# Altium footprint library SIMCard.PcbLib: 15 footprints
Each footprint in its own frame and in the unit in brackets; x right, y up, seen from the top. Pads: shape width x height; smd on the part's side, far side on the other; paste and mask are expansions set on the pad; w line width, h text height; cw(c..) or ccw(c..) is an arc to the next point about the centre after c.
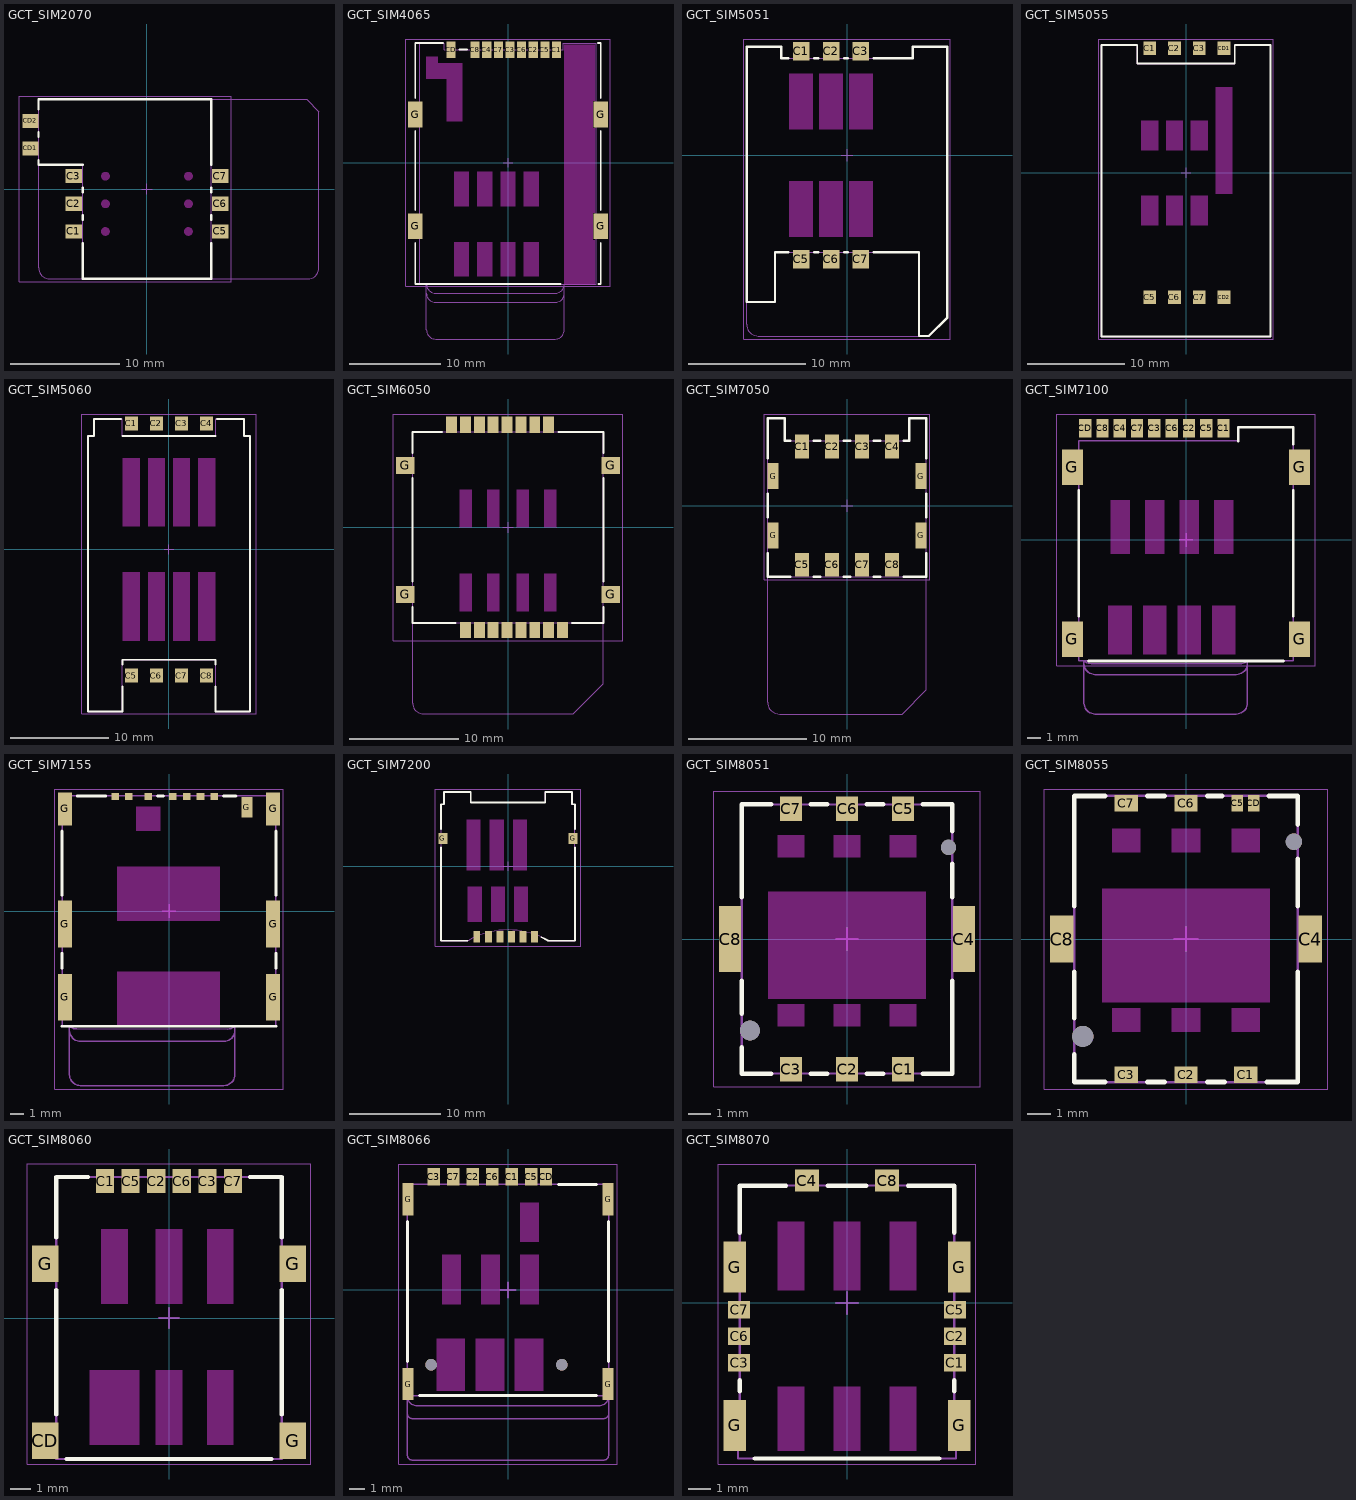
[diagram p0: the footprints below, top view; thin cyan lines are the x and y axes]

## GCT_SIM2070 [mm]
height 3
pads (8):
  rect 1.49x1.3 smd mask+0.07: C1(-6.73,-3.9) C2(-6.73,-1.36) C3(-6.73,1.18) C5(6.73,-3.9) C6(6.73,-1.36) C7(6.73,1.18) CD1(-10.695,3.72) CD2(-10.695,6.26)
Top Layer keep-out:
  circle w0.4: c-3.81,-3.9 r0.2
  circle w0.4: c-3.81,-1.36 r0.2
  circle w0.4: c-3.81,1.18 r0.2
  circle w0.4: c3.81,1.18 r0.2
  circle w0.4: c3.81,-1.36 r0.2
  circle w0.4: c3.81,-3.9 r0.2
Top Overlay:
  lines w0.2: -9.95,2.67 -9.95,2.23 -5.9,2.23 ; -9.95,4.77 -9.95,5.21 ; -9.95,7.31 -9.95,8.25 5.9,8.25 5.9,2.23 ; -5.9,-4.95 -5.9,-8.25 5.9,-8.25 5.9,-4.95 ; -5.9,-2.85 -5.9,-2.41 ; -5.9,-0.31 -5.9,0.13 ; 5.9,-2.85 5.9,-2.41 ; 5.9,-0.31 5.9,0.13
Top Assembly:
  lines w0.1: -9.95,2.23 -9.95,8.25 5.9,8.25 5.9,-8.25 -5.9,-8.25 -5.9,2.23 -9.95,2.23
  text ".Designator" at -2.252,-0.226 h1
Top Courtyard:
  lines w0.05: -11.75,-8.5 -11.75,8.5 7.75,8.5 7.75,-8.5 -11.75,-8.5
  lines w0.1: -0.5,0 0.5,0 ; 0,-0.5 0,0.5
Assembly Notes:
  lines w0.1: -9.95,2.23 -9.95,-7.25 ccw(c-8.95,-7.25) -8.95,-8.25 -5.9,-8.25 ; 5.9,-8.25 14.8,-8.25 ccw(c14.8,-7.25) 15.8,-7.25 15.8,7.111 14.661,8.25 5.9,8.25
3D body "sim2070-6-0-30-00-a.stp": height 3.46, standoff 0, extent -10.925,-8.32 7.123,8.32

## GCT_SIM4065 [mm]
height 1.7
pads (13):
  rect 1x1.8 smd mask+0.07: C1(5.3,12.35) C2(2.76,12.35) C3(0.22,12.35) C4(-2.32,12.35) C5(4.03,12.35) C6(1.49,12.35) C7(-1.05,12.35) C8(-3.59,12.35) CD(-6.21,12.35)
  rect 1.55x2.8 smd mask+0.07: G(-10.125,-6.95) G(-10.125,5.25) G(10.125,-6.95) G(10.125,5.25)
Top Layer keep-out:
  region: -7.65,10.85 -5,10.85 -5,4.5 -6.7,4.5 -6.7,9.15 -8.9,9.15 -8.9,11.55 -7.65,11.55
  region: -4.28,-4.78 -5.88,-4.78 -5.88,-0.98 -4.28,-0.98
  region: -4.28,-12.38 -5.88,-12.38 -5.88,-8.68 -4.28,-8.68
  region: -1.74,-12.38 -3.34,-12.38 -3.34,-8.68 -1.74,-8.68
  region: -1.74,-4.78 -3.34,-4.78 -3.34,-0.98 -1.74,-0.98
  region: 0.8,-4.78 -0.8,-4.78 -0.8,-0.98 0.8,-0.98
  region: 0.8,-12.38 -0.8,-12.38 -0.8,-8.68 0.8,-8.68
  region: 3.34,-12.38 1.74,-12.38 1.74,-8.68 3.34,-8.68
  region: 3.34,-4.78 1.74,-4.78 1.74,-0.98 3.34,-0.98
  region: 9.45,6.75 9.25,6.75 9.25,3.75 9.45,3.75 9.45,-5.45 9.25,-5.45 9.25,-8.45 9.45,-8.45 9.45,-13.25 6.15,-13.25 6.15,12.85 9.45,12.85
Top Overlay:
  lines w0.2: -10.125,-8.75 -10.125,-13.25 5.75,-13.25 ; -10.125,-5.15 -10.125,3.45 ; -10.125,7.05 -10.125,13.05 -7.11,13.05 ; -5.31,12.35 -4.49,12.35 ; 9.839,13.05 10.125,13.05 10.125,7.05 ; 9.85,-13.25 10.125,-13.25 10.125,-8.75 ; 10.125,-5.15 10.125,3.45
Top Assembly:
  lines w0.1: -9.65,-13.25 -9.65,13.05 -6.96,13.05 -6.96,12.35 6.05,12.35 6.05,13.05 9.65,13.05 9.65,-13.25 -9.65,-13.25
  text ".Designator" at -2.252,-0.226 h1
Top Courtyard:
  lines w0.05: -11.15,-13.5 -11.15,13.5 11.15,13.5 11.15,-13.5 -11.15,-13.5
  lines w0.1: -0.5,0 0.5,0 ; 0,-0.5 0,0.5
Assembly Notes:
  lines w0.1: -8.9,-14.25 ccw(c-7.9,-14.25) -7.9,-15.25 5.147,-15.25 ccw(c5.147,-14.25) 6.147,-14.25 ; -8.9,-18.25 ccw(c-7.9,-18.25) -7.9,-19.25 5.147,-19.25 ccw(c5.147,-18.25) 6.147,-18.25 6.147,-13.25 cw(c5.147,-13.25) 5.147,-14.25 -7.9,-14.25 cw(c-7.9,-13.25) -8.9,-13.25 -8.9,-18.25
  text "Location of card pushed" at 0.208,-14.12 h0.51
  text "Location of card inserted" at 0.208,-15.163 h0.51
  text "Location of card ejected" at 0.208,-19.118 h0.51
3D body "sim4065-8-1-15-00-a.stp": height 1.66, standoff 0.01, extent -10.5,-13.2 10.5,13.2

## GCT_SIM5051 [mm]
height 1.85
pads (6):
  rect 1.4x1.6 smd mask+0.07: C1(-3.9,8.85) C2(-1.36,8.85) C3(1.18,8.85) C5(-3.9,-8.85) C6(-1.36,-8.85) C7(1.18,-8.85)
Top Layer keep-out:
  region: 2.18,-6.95 0.18,-6.95 0.18,-2.2 2.18,-2.2
  region: -0.36,-6.95 -2.36,-6.95 -2.36,-2.2 -0.36,-2.2
  region: -2.9,-6.95 -4.9,-6.95 -4.9,-2.2 -2.9,-2.2
  region: -2.9,2.2 -4.9,2.2 -4.9,6.95 -2.9,6.95
  region: -0.36,2.2 -2.36,2.2 -2.36,6.95 -0.36,6.95
  region: 2.18,2.2 0.18,2.2 0.18,6.95 2.18,6.95
Top Overlay:
  lines w0.2: -5,-8.25 -6.13,-8.25 -6.13,-12.5 -8.55,-12.5 -8.55,9.25 -5.6,9.25 -5.6,8.25 -5,8.25 ; -2.8,-8.25 -2.46,-8.25 ; -2.8,8.25 -2.46,8.25 ; -0.26,-8.25 0.08,-8.25 ; -0.26,8.25 0.08,8.25 ; 2.28,-8.25 6.13,-8.25 6.13,-15.4 6.97,-15.4 8.55,-13.82 8.55,9.25 5.6,9.25 5.6,8.25 2.28,8.25
Top Assembly:
  lines w0.1: -8.55,-12.5 -6.13,-12.5 -6.13,-8.25 6.13,-8.25 6.13,-15.4 6.97,-15.4 8.55,-13.82 8.55,9.25 5.6,9.25 5.6,8.25 -5.6,8.25 -5.6,9.25 -8.55,9.25 -8.55,-12.5
  text ".Designator" at -2.252,-0.226 h1
Top Courtyard:
  lines w0.05: -8.8,-15.65 -8.8,9.9 8.8,9.9 8.8,-15.65 -8.8,-15.65
  lines w0.1: -0.5,0 0.5,0 ; 0,-0.5 0,0.5
Assembly Notes:
  lines w0.1: -8.55,-12.5 -8.55,-14.4 ccw(c-7.55,-14.4) -7.55,-15.4 6.13,-15.4
  text "Card Area" at 3.885,-15.263 h0.51
3D body "sim5051-6-0-18-00-a.stp": height 1.88, standoff -0.02, extent -8.876,-15.65 8.824,9

## GCT_SIM5055 [mm]
height 2.5
pads (8):
  rect 1.3x1.4 smd mask+0.07: C1(-3.72,12.77) C2(-1.18,12.77) C3(1.36,12.77) C5(-3.72,-12.77) C6(-1.18,-12.77) C7(1.36,-12.77) CD1(3.9,12.77) CD2(3.9,-12.77)
Top Layer keep-out:
  region: 4.75,-2.15 3.05,-2.15 3.05,8.78 4.75,8.78
  region: 2.21,2.32 0.51,2.32 0.51,5.32 2.21,5.32
  region: -0.33,2.32 -2.03,2.32 -2.03,5.32 -0.33,5.32
  region: -2.87,2.32 -4.57,2.32 -4.57,5.32 -2.87,5.32
  region: -2.87,-5.37 -4.57,-5.37 -4.57,-2.37 -2.87,-2.37
  region: -0.33,-5.37 -2.03,-5.37 -2.03,-2.37 -0.33,-2.37
  region: 2.21,-5.37 0.51,-5.37 0.51,-2.37 2.21,-2.37
Top Overlay:
  lines w0.2: -8.68,-16.8 8.68,-16.8 8.68,13.1 5,13.1 5,11.2 -5,11.2 -5,13.1 -8.68,13.1 -8.68,-16.8
Top Assembly:
  lines w0.1: -8.68,-16.8 8.68,-16.8 8.68,13.1 5,13.1 5,11.2 -5,11.2 -5,13.1 -8.68,13.1 -8.68,-16.8
  text ".Designator" at -2.252,-0.226 h1
Top Courtyard:
  lines w0.05: -8.93,-17.05 8.93,-17.05 8.93,13.72 -8.93,13.72 -8.93,-17.05
  lines w0.1: -0.5,0 0.5,0 ; 0,-0.5 0,0.5
3D body "sim5055-6-1-25-00-a.stp": height 2.55, standoff 0, extent -8.675,-16.65 8.675,13.25

## GCT_SIM5060 [mm]
height 2.6
pads (8):
  rect 1.3x1.4 smd mask+0.07: C1(-3.81,12.77) C2(-1.27,12.77) C3(1.27,12.77) C4(3.81,12.77) C5(-3.81,-12.77) C6(-1.27,-12.77) C7(1.27,-12.77) C8(3.81,-12.77)
Top Layer keep-out:
  region: 4.66,-9.23 2.96,-9.23 2.96,-2.33 4.66,-2.33
  region: 2.12,-9.23 0.42,-9.23 0.42,-2.33 2.12,-2.33
  region: -0.42,-9.23 -2.12,-9.23 -2.12,-2.33 -0.42,-2.33
  region: -2.96,-9.23 -4.66,-9.23 -4.66,-2.33 -2.96,-2.33
  region: -2.96,2.33 -4.66,2.33 -4.66,9.23 -2.96,9.23
  region: -0.42,2.33 -2.12,2.33 -2.12,9.23 -0.42,9.23
  region: 2.12,2.33 0.42,2.33 0.42,9.23 2.12,9.23
  region: 4.66,2.33 2.96,2.33 2.96,9.23 4.66,9.23
Top Overlay:
  lines w0.2: -4.86,13.23 -7.6,13.23 -7.6,11.5 -8.2,11.5 -8.2,-16.42 -4.73,-16.42 -4.73,-13.87 ; -4.73,-11.67 -4.73,-11.175 4.73,-11.175 4.73,-11.67 ; -4.73,11.5 4.73,11.5 ; 4.73,-13.87 4.73,-16.42 8.2,-16.42 8.2,11.5 7.6,11.5 7.6,13.23 4.86,13.23
Top Assembly:
  lines w0.1: -8.2,-16.42 -8.2,11.5 -7.6,11.5 -7.6,13.23 -4.73,13.23 -4.73,11.5 4.73,11.5 4.73,13.23 7.6,13.23 7.6,11.5 8.2,11.5 8.2,-16.42 4.73,-16.42 4.73,-11.175 -4.73,-11.175 -4.73,-16.42 -8.2,-16.42
  text ".Designator" at -2.252,-0.226 h1
Top Courtyard:
  lines w0.05: -8.85,-16.67 -8.85,13.72 8.85,13.72 8.85,-16.67 -8.85,-16.67
  lines w0.1: -0.5,0 0.5,0 ; 0,-0.5 0,0.5
3D body "sim5060-6-0-26-00-a.stp": height 2.6, standoff 0, extent -8.6,-16.42 8.6,13.23

## GCT_SIM6050 [mm]
height 3
pads (20):
  rect 1x1.5 smd mask+0.07: B_C1(-2.63,-9.4) B_C2(-0.09,-9.4) B_C3(2.45,-9.4) B_C4(4.99,-9.4) B_C5(-3.9,-9.4) B_C6(-1.36,-9.4) B_C7(1.18,-9.4) B_C8(3.72,-9.4) T_C1(-3.9,9.4) T_C2(-1.36,9.4) T_C3(1.18,9.4) T_C4(3.72,9.4) T_C5(-5.17,9.4) T_C6(-2.63,9.4) T_C7(-0.09,9.4) T_C8(2.45,9.4)
  rect 1.7x1.55 smd mask+0.07: G(-9.42,-6.13) G(-9.42,5.68) G(9.42,-6.13) G(9.42,5.68)
Top Layer keep-out:
  rectangle: 3.315,-7.7 4.465,-4.2
  rectangle: 0.775,-7.7 1.925,-4.2
  rectangle: -1.925,-7.7 -0.775,-4.2
  rectangle: -4.465,-7.7 -3.315,-4.2
  rectangle: -4.465,0 -3.315,3.5
  rectangle: -1.925,0 -0.775,3.5
  rectangle: 0.775,0 1.925,3.5
  rectangle: 3.315,0 4.465,3.5
Top Overlay:
  lines w0.2: -8.75,-7.305 -8.75,-8.75 -4.8,-8.75 ; -8.75,-4.955 -8.75,4.505 ; -8.75,6.855 -8.75,8.75 -6.07,8.75 ; 4.62,8.75 8.75,8.75 8.75,6.855 ; 5.89,-8.75 8.75,-8.75 8.75,-7.305 ; 8.75,-4.955 8.75,4.505
Top Assembly:
  lines w0.1: -8.75,-8.75 8.75,-8.75 8.75,8.75 -8.75,8.75 -8.75,-8.75
  text ".Designator" at -2.252,-0.226 h1
Top Courtyard:
  lines w0.05: -10.52,-10.4 -10.52,10.4 10.52,10.4 10.52,-10.4 -10.52,-10.4
  lines w0.1: -0.5,0 0.5,0 ; 0,-0.5 0,0.5
Assembly Notes:
  lines w0.1: -8.75,-8.75 -8.75,-16.1 ccw(c-7.75,-16.1) -7.75,-17.1 5.963,-17.1 8.75,-14.313 8.75,-8.75
3D body "sim6050-8-0-30-00-a.stp": height 2.99, standoff -0.05, extent -9.55,-9.744 9.55,9.756

## GCT_SIM7050 [mm]
height 2.4
pads (12):
  rect 1.2x2 smd mask+0.07: C1(-3.81,5) C2(-1.27,5) C3(1.27,5) C4(3.81,5) C5(-3.81,-5) C6(-1.27,-5) C7(1.27,-5) C8(3.81,-5)
  rect 0.9x2.2 smd mask+0.07: G(-6.25,-2.5) G(-6.25,2.5) G(6.25,-2.5) G(6.25,2.5)
Top Overlay:
  lines w0.2: -6.7,-4 -6.7,-6 -4.81,-6 ; -6.7,-1 -6.7,1 ; -6.7,4 -6.7,7.4 -5.25,7.4 -5.25,5.5 -4.81,5.5 ; -2.81,-6 -2.27,-6 ; -2.81,5.5 -2.27,5.5 ; -0.27,-6 0.27,-6 ; -0.27,5.5 0.27,5.5 ; 2.27,-6 2.81,-6 ; 2.27,5.5 2.81,5.5 ; 4.81,-6 6.7,-6 6.7,-4 ; 4.81,5.5 5.25,5.5 5.25,7.4 6.7,7.4 6.7,4 ; 6.7,-1 6.7,1
Top Assembly:
  lines w0.1: -6.7,-6 -6.7,7.4 -5.25,7.4 -5.25,5.5 5.25,5.5 5.25,7.4 6.7,7.4 6.7,-6 -6.7,-6
  text ".Designator" at -2.252,-0.226 h1
Top Courtyard:
  lines w0.05: -7,-6.25 7,-6.25 7,7.75 -7,7.75 -7,-6.25
  lines w0.1: -0.5,0 0.5,0 ; 0,-0.5 0,0.5
Assembly Notes:
  lines w0.1: -6.7,-6 -6.7,-16.6 ccw(c-5.7,-16.6) -5.7,-17.6 4.65,-17.6 6.7,-15.55 6.7,-6
3D body "SIM7050-6-0-00-A.stp": height 2.4, standoff -0.05, extent -6.705,-6 6.705,7.4

## GCT_SIM7100 [mm]
height 1.8
pads (13):
  rect 0.9x1.35 smd mask+0.07: C1(2.755,8.215) C2(0.215,8.215) C3(-2.325,8.215) C4(-4.865,8.215) C5(1.485,8.215) C6(-1.055,8.215) C7(-3.595,8.215) C8(-6.135,8.215) CD(-7.405,8.215)
  rect 1.56x2.61 smd mask+0.07: G(-8.34,-7.29) G(-8.34,5.34) G(8.34,-7.29) G(8.34,5.34)
Top Layer keep-out:
  region: 3.475,-1.03 2.075,-1.03 2.075,2.91 3.475,2.91
  region: 0.935,-1.03 -0.465,-1.03 -0.465,2.91 0.935,2.91
  region: -1.605,-1.03 -3.005,-1.03 -3.005,2.91 -1.605,2.91
  region: -4.145,-1.03 -5.545,-1.03 -5.545,2.91 -4.145,2.91
  region: -3.995,-8.41 -5.695,-8.41 -5.695,-4.83 -3.995,-4.83
  region: -1.455,-8.41 -3.155,-8.41 -3.155,-4.83 -1.455,-4.83
  region: 1.085,-8.41 -0.615,-8.41 -0.615,-4.83 1.085,-4.83
  region: 3.625,-8.41 1.925,-8.41 1.925,-4.83 3.625,-4.83
Top Overlay:
  lines w0.2: -7.875,-5.585 -7.875,3.635 ; -7.16,-8.89 7.16,-8.89 ; 3.84,7.27 3.84,8.28 7.875,8.28 7.875,7.045 ; 7.875,-5.585 7.875,3.635
Top Assembly:
  lines w0.1: -7.875,-8.89 -7.875,7.27 3.84,7.27 3.84,8.28 7.875,8.28 7.875,-8.89 -7.875,-8.89
  text ".Designator" at -2.252,-0.226 h1
Top Courtyard:
  lines w0.05: -9.5,-9.25 -9.5,9.25 9.5,9.25 9.5,-9.25 -9.5,-9.25
  lines w0.1: -0.5,0 0.5,0 ; 0,-0.5 0,0.5
Assembly Notes:
  lines w0.1: -7.495,-9.09 ccw(c-6.695,-9.09) -6.695,-9.89 3.705,-9.89 ccw(c3.705,-9.09) 4.505,-9.09 ; -7.495,-8.89 -7.495,-11.99 ccw(c-6.695,-11.99) -6.695,-12.79 3.705,-12.79 ccw(c3.705,-11.99) 4.505,-11.99 4.505,-8.89 cw(c3.97,-8.276) 3.985,-9.09 -6.964,-9.09 cw(c-6.95,-8.262) -7.493,-8.887
  text "Location of card pushed" at -1.2,-8.96 h0.51
  text "Location of card inserted" at -1.2,-9.803 h0.51
  text "Location of card ejected" at -1.2,-12.658 h0.51
3D body "SIM7100-6-1-15-00-A.stp": height 1.48, standoff -0.05, extent -8.362,-8.93 8.388,8.4

## GCT_SIM7155 [mm]
height 1.53
pads (14):
  rect 0.55x0.5 smd mask+0.07: C1(2.285,8.3) C2(0.285,8.3) C3(-3.905,8.3) C5(3.285,8.3) C6(1.285,8.3) C7(-2.905,8.3) CD(-1.5,8.3)
  rect 1x3.4 smd mask+0.07: G(-7.55,-6.25) G(-7.55,-0.95) G(7.55,-6.25) G(7.55,-0.95)
  rect 1x2.4 smd mask+0.07: G(-7.55,7.4) G(7.55,7.4)
  rect 0.8x1.5 smd mask+0.07: G(5.65,7.53)
Top Layer keep-out:
  region: -0.65,5.83 -2.39,5.83 -2.39,7.57 -0.65,7.57
  region: 3.67,-0.69 -3.75,-0.69 -3.75,3.21 3.67,3.21
  region: 3.67,-8.3 -3.75,-8.3 -3.75,-4.4 3.67,-4.4
Top Overlay:
  lines w0.2: -7.75,-8.35 7.75,-8.35 ; -7.75,-4.15 -7.75,-3.05 ; -7.75,1.15 -7.75,5.8 ; -6.65,8.35 -4.58,8.35 ; -0.825,8.35 -0.39,8.35 ; 3.96,8.35 4.85,8.35 ; 7.75,-4.15 7.75,-3.05 ; 7.75,1.15 7.75,5.8
Top Assembly:
  lines w0.1: -7.75,-8.35 7.75,-8.35 7.75,8.35 -7.75,8.35 -7.75,-8.35
  text ".Designator" at -2.252,-0.226 h1
Top Courtyard:
  lines w0.05: -8.3,-12.9 -8.3,8.85 8.3,8.85 8.3,-12.9 -8.3,-12.9
  lines w0.1: -0.5,0 0.5,0 ; 0,-0.5 0,0.5
Assembly Notes:
  lines w0.1: -7.22,-8.65 ccw(c-6.42,-8.65) -6.42,-9.45 3.98,-9.45 ccw(c3.98,-8.65) 4.78,-8.65 ; -7.22,-8.35 -7.22,-11.85 ccw(c-6.42,-11.85) -6.42,-12.65 3.98,-12.65 ccw(c3.98,-11.85) 4.78,-11.85 4.78,-8.35 ; -7.218,-8.347 ccw(c-6.675,-7.722) -6.689,-8.55 4.259,-8.55 ccw(c4.245,-7.736) 4.779,-8.35
  text "Location of card ejected" at -1,-12.518 h0.51
  text "Location of card inserted" at -1,-9.363 h0.51
  text "Location of card pushed" at -1,-8.42 h0.51
3D body "sim7155-6-1-14-a.stp": height 1.43, standoff 0, extent -7.78,-8.32 7.78,8.45

## GCT_SIM7200 [mm]
height 1.75
pads (8):
  rect 0.75x1.25 smd mask+0.07: C1(-2.16,-7.75) C2(0.38,-7.75) C3(2.92,-7.75) C5(-3.43,-7.75) C6(-0.89,-7.75) C7(1.65,-7.75)
  rect 1x1.2 smd mask+0.07: G(-7.15,3.075) G(7.15,3.075)
Top Layer keep-out:
  region: 2.05,-0.405 0.55,-0.405 0.55,5.095 2.05,5.095
  region: -0.49,-0.405 -1.99,-0.405 -1.99,5.095 -0.49,5.095
  region: -3.03,-0.405 -4.53,-0.405 -4.53,5.095 -3.03,5.095
  region: -2.9,-6.105 -4.4,-6.105 -4.4,-2.215 -2.9,-2.215
  region: -0.36,-6.105 -1.86,-6.105 -1.86,-2.215 -0.36,-2.215
  region: 2.18,-6.105 0.68,-6.105 0.68,-2.215 2.18,-2.215
Top Overlay:
  lines w0.2: -7.35,2.075 -7.35,-8.175 -4.42,-8.175 ; -7.35,4.075 -7.35,6.825 -7.025,6.825 -7.025,8.175 -4.095,8.175 -4.095,7.025 4.095,7.025 4.095,8.175 7.025,8.175 7.025,6.825 7.35,6.825 7.35,4.075 ; 3.695,-7.794 cw(c0,-15.715) 4.37,-8.146 ; 4.42,-8.175 7.35,-8.175 7.35,2.075
Top Assembly:
  lines w0.1: -4.42,-8.175 -7.35,-8.175 -7.35,6.825 -7.025,6.825 -7.025,8.175 -4.095,8.175 -4.095,7.025 4.095,7.025 4.095,8.175 7.025,8.175 7.025,6.825 7.35,6.825 7.35,-8.175 4.42,-8.175 ; -4.37,-8.146 cw(c0,-15.715) 4.37,-8.146
  text ".Designator" at -2.252,-0.226 h1
Top Courtyard:
  lines w0.05: -8,-8.75 8,-8.75 8,8.5 -8,8.5 -8,-8.75
  lines w0.1: -0.5,0 0.5,0 ; 0,-0.5 0,0.5
3D body "step_temp.STEP": height 1.74, standoff -0.01, extent -7.355,-8.235 7.345,8.115

## GCT_SIM8051 [mm]
height 1.35
pads (10):
  rect 1x1.1 smd mask+0.07: C1(2.54,-5.9) C2(0,-5.9) C3(-2.54,-5.9) C5(2.54,5.9) C6(0,5.9) C7(-2.54,5.9)
  rect 1x3 smd mask+0.07: C4(5.3,0) C8(-5.3,0)
  round 0.9 hole 0.9 unplated mask+0.07: ""(-4.4,-4.15)
  round 0.7 hole 0.7 unplated mask+0.07: ""(4.6,4.15)
Top Layer keep-out:
  region: 3.14,3.7 1.94,3.7 1.94,4.7 3.14,4.7
  region: 0.6,3.7 -0.6,3.7 -0.6,4.7 0.6,4.7
  region: -1.94,3.7 -3.14,3.7 -3.14,4.7 -1.94,4.7
  region: 3.575,-2.7 -3.575,-2.7 -3.575,2.15 3.575,2.15
  region: -1.94,-3.95 -3.14,-3.95 -3.14,-2.95 -1.94,-2.95
  region: 0.6,-3.95 -0.6,-3.95 -0.6,-2.95 0.6,-2.95
  region: 3.14,-3.95 1.94,-3.95 1.94,-2.95 3.14,-2.95
Top Overlay:
  lines w0.2: -4.77,-4.915 -4.77,-6.1 -3.44,-6.1 ; -4.77,-3.385 -4.77,-1.9 ; -4.77,1.9 -4.77,6.1 -3.44,6.1 ; -1.64,-6.1 -0.9,-6.1 ; -1.64,6.1 -0.9,6.1 ; 0.9,-6.1 1.64,-6.1 ; 0.9,6.1 1.64,6.1 ; 3.44,-6.1 4.77,-6.1 4.77,-1.9 ; 3.44,6.1 4.77,6.1 4.77,4.881 ; 4.77,1.9 4.77,3.419
Top Assembly:
  lines w0.1: -4.77,-6.1 -4.77,6.1 4.77,6.1 4.77,-6.1 -4.77,-6.1
  text "PCB Edge" at 2.566,-5.918 h0.51
  text ".Designator" at -2.252,-0.226 h1
Top Courtyard:
  lines w0.05: -6.05,-6.7 -6.05,6.7 6.05,6.7 6.05,-6.7 -6.05,-6.7
  lines w0.1: -0.5,0 0.5,0 ; 0,-0.5 0,0.5
3D body "step_temp.STEP": height 1.35, standoff 0, extent -5.4,-6.1 5.4,6.1

## GCT_SIM8055 [mm]
height 1.35
pads (11):
  rect 1x0.7 smd mask+0.07: C1(2.54,-5.795) C2(0,-5.795) C3(-2.54,-5.795) C6(0,5.795) C7(-2.54,5.795)
  rect 1x2 smd mask+0.07: C4(5.3,0) C8(-5.3,0)
  rect 0.5x0.7 smd mask+0.07: C5(2.19,5.795) CD(2.89,5.795)
  round 0.9 hole 0.9 unplated mask+0.07: ""(-4.4,-4.15)
  round 0.7 hole 0.7 unplated mask+0.07: ""(4.6,4.15)
Top Layer keep-out:
  region: 3.14,3.7 1.94,3.7 1.94,4.7 3.14,4.7
  region: 0.6,3.7 -0.6,3.7 -0.6,4.7 0.6,4.7
  region: -1.94,3.7 -3.14,3.7 -3.14,4.7 -1.94,4.7
  region: 3.575,-2.7 -3.575,-2.7 -3.575,2.15 3.575,2.15
  region: -1.94,-3.95 -3.14,-3.95 -3.14,-2.95 -1.94,-2.95
  region: 0.6,-3.95 -0.6,-3.95 -0.6,-2.95 0.6,-2.95
  region: 3.14,-3.95 1.94,-3.95 1.94,-2.95 3.14,-2.95
Top Overlay:
  lines w0.2: -4.77,-4.915 -4.77,-6.1 -3.44,-6.1 ; -4.77,-3.385 -4.77,-1.4 ; -4.77,1.4 -4.77,6.1 -3.44,6.1 ; -1.64,-6.1 -0.9,-6.1 ; -1.64,6.1 -0.9,6.1 ; 0.9,-6.1 1.64,-6.1 ; 0.9,6.1 1.54,6.1 ; 3.44,-6.1 4.77,-6.1 4.77,-1.4 ; 3.54,6.1 4.77,6.1 4.77,4.881 ; 4.77,1.4 4.77,3.419
Top Assembly:
  lines w0.1: -4.77,-6.1 -4.77,6.1 4.77,6.1 4.77,-6.1 -4.77,-6.1
  text "PCB Edge" at 2.566,-5.918 h0.51
  text ".Designator" at -2.252,-0.226 h1
Top Courtyard:
  lines w0.05: -6.05,-6.395 6.05,-6.395 6.05,6.395 -6.05,6.395 -6.05,-6.395
  lines w0.1: -0.5,0 0.5,0 ; 0,-0.5 0,0.5
3D body "SIM8055-6-1-14-00-A.stp": height 1.35, standoff 0, extent -5.4,-6.1 5.4,6.1

## GCT_SIM8060 [mm]
height 1.4
pads (10):
  rect 0.9x1.2 smd mask+0.07: C1(-3.175,6.8) C2(-0.635,6.8) C3(1.905,6.8) C5(-1.905,6.8) C6(0.635,6.8) C7(3.175,6.8)
  rect 1.3x1.8 smd mask+0.07: CD(-6.15,-6.1) G(-6.15,2.7) G(6.15,-6.1) G(6.15,2.7)
Top Layer keep-out:
  region: 3.19,-6.3 1.89,-6.3 1.89,-2.6 3.19,-2.6
  region: 0.65,-6.3 -0.65,-6.3 -0.65,-2.6 0.65,-2.6
  region: -1.49,-6.3 -3.93,-6.3 -3.93,-2.6 -1.49,-2.6
  region: -2.06,0.72 -3.36,0.72 -3.36,4.42 -2.06,4.42
  region: 0.65,0.72 -0.65,0.72 -0.65,4.42 0.65,4.42
  region: 3.19,0.72 1.89,0.72 1.89,4.42 3.19,4.42
Top Overlay:
  lines w0.2: -5.6,-4.8 -5.6,1.4 ; -5.6,4 -5.6,7 -4.025,7 ; -5.1,-7 5.1,-7 ; 4.025,7 5.6,7 5.6,4 ; 5.6,-4.8 5.6,1.4
Top Assembly:
  lines w0.1: -5.6,-7 -5.6,7 5.6,7 5.6,-7 -5.6,-7
  text ".Designator" at -2.252,-0.226 h1
Top Courtyard:
  lines w0.05: -7.05,-7.25 -7.05,7.65 7.05,7.65 7.05,-7.25 -7.05,-7.25
  lines w0.1: -0.5,0 0.5,0 ; 0,-0.5 0,0.5
3D body "sim8060-6-0-14-00-a.stp": height 1.4, standoff -0.03, extent -6.2,-7 6.2,7.1

## GCT_SIM8066 [mm]
height 1.44
pads (13):
  rect 0.8x1.14 smd mask+0.07: C1(0.25,7.37) C2(-2.29,7.37) C3(-4.83,7.37) C5(1.52,7.37) C6(-1.02,7.37) C7(-3.56,7.37) CD(2.47,7.37)
  rect 0.7x2.1 smd mask+0.07: G(-6.5,-6.11) G(-6.5,5.89) G(6.5,-6.11) G(6.5,5.89)
  round 0.75 hole 0.75 unplated mask+0.07: ""(-5,-4.86) ""(3.5,-4.86)
Top Layer keep-out:
  region: 2.285,-6.56 0.435,-6.56 0.435,-3.16 2.285,-3.16
  region: -0.255,-6.56 -2.105,-6.56 -2.105,-3.16 -0.255,-3.16
  region: -2.795,-6.56 -4.645,-6.56 -4.645,-3.16 -2.795,-3.16
  region: -3.08,-0.915 -4.28,-0.915 -4.28,2.295 -3.08,2.295
  region: -0.54,-0.915 -1.74,-0.915 -1.74,2.295 -0.54,2.295
  region: 2,-0.915 0.8,-0.915 0.8,2.295 2,2.295
  region: 2,3.135 0.8,3.135 0.8,5.685 2,5.685
Top Overlay:
  lines w0.2: -6.545,-4.66 -6.545,4.44 ; -5.75,-6.86 5.75,-6.86 ; 3.27,6.86 5.75,6.86 ; 6.545,-4.66 6.545,4.44
Top Assembly:
  lines w0.1: -6.545,-6.86 -6.545,6.86 6.545,6.86 6.545,-6.86 -6.545,-6.86
  text ".Designator" at -2.252,-0.226 h1
Top Courtyard:
  lines w0.05: -7.1,-11.31 7.1,-11.31 7.1,8.19 -7.1,8.19 -7.1,-11.31
  lines w0.1: -0.5,0 0.5,0 ; 0,-0.5 0,0.5
Assembly Notes:
  lines w0.1: -6.545,-10.713 ccw(c-6.198,-10.713) -6.198,-11.06 ; -6.545,-10.71 -6.545,-6.86 ccw(c-5.947,-6.913) -6,-7.51 6,-7.51 ccw(c5.947,-6.913) 6.545,-6.86 6.545,-10.71 ; -6.545,-8.013 ccw(c-6.198,-8.013) -6.198,-8.36 ; -6.2,-11.06 6.2,-11.06 ; -6.2,-8.36 6.2,-8.36 ccw(c6.222,-8.037) 6.545,-8.06 ; 6.198,-11.06 ccw(c6.198,-10.713) 6.545,-10.713
  text "Push Stroke Position" at 1.9,-7.363 h0.51
  text "Push Lock Position" at 1.9,-8.26 h0.51
  text "Push Eject Position" at 1.9,-10.915 h0.51
3D body "SIM8066-6-1-14-01-A--3DModel-STEP-56544.STEP": height 1.44, standoff -0.37, extent -6.545,-6.94 6.545,7.64

## GCT_SIM8070 [mm]
height 1.25
pads (12):
  rect 1x0.8 smd mask+0.07: C1(4.9,-2.715) C2(4.9,-1.515) C3(-4.9,-2.715) C5(4.9,-0.315) C6(-4.9,-1.515) C7(-4.9,-0.315)
  rect 1.1x1 smd mask+0.07: C4(-1.82,5.565) C8(1.82,5.565)
  rect 1x2.3 smd mask+0.07: G(-5.1,-5.565) G(-5.1,1.635) G(5.1,-5.565) G(5.1,1.635)
Top Layer keep-out:
  region: 3.14,-6.715 1.94,-6.715 1.94,-3.815 3.14,-3.815
  region: 0.6,-6.715 -0.6,-6.715 -0.6,-3.815 0.6,-3.815
  region: -1.94,-6.715 -3.14,-6.715 -3.14,-3.815 -1.94,-3.815
  region: -1.94,0.585 -3.14,0.585 -3.14,3.685 -1.94,3.685
  region: 0.6,0.585 -0.6,0.585 -0.6,3.685 0.6,3.685
  region: 3.14,0.585 1.94,0.585 1.94,3.685 3.14,3.685
Top Overlay:
  lines w0.2: -4.875,-4.015 -4.875,-3.515 ; -4.875,3.185 -4.875,5.335 -2.77,5.335 ; -4.2,-7.065 4.2,-7.065 ; -0.87,5.335 0.87,5.335 ; 2.77,5.335 4.875,5.335 4.875,3.185 ; 4.875,-4.015 4.875,-3.515
Top Assembly:
  lines w0.1: -4.95,-7.065 4.95,-7.065 4.95,-6.545 4.875,-6.545 4.875,5.335 -4.875,5.335 -4.875,-6.545 -4.95,-6.545 -4.95,-7.065
  text "PCB Edge" at 2.666,-6.883 h0.51
  text ".Designator" at -2.252,-0.226 h1
Top Courtyard:
  lines w0.05: -5.85,-7.315 -5.85,6.315 5.85,6.315 5.85,-7.315 -5.85,-7.315
  lines w0.1: -0.5,0 0.5,0 ; 0,-0.5 0,0.5
3D body "SIM8070-6-0-11-00-A.stp": height 1.11, standoff 0, extent -5.175,-6.965 5.175,5.585